# Altium footprint library MOLEX THD.PcbLib: 71 footprints (part 3 of 5)
Each footprint in its own frame and in the unit in brackets; x right, y up, seen from the top. Pads: shape width x height; smd on the part's side, far side on the other; paste and mask are expansions set on the pad; w line width, h text height; cw(c..) or ccw(c..) is an arc to the next point about the centre after c.
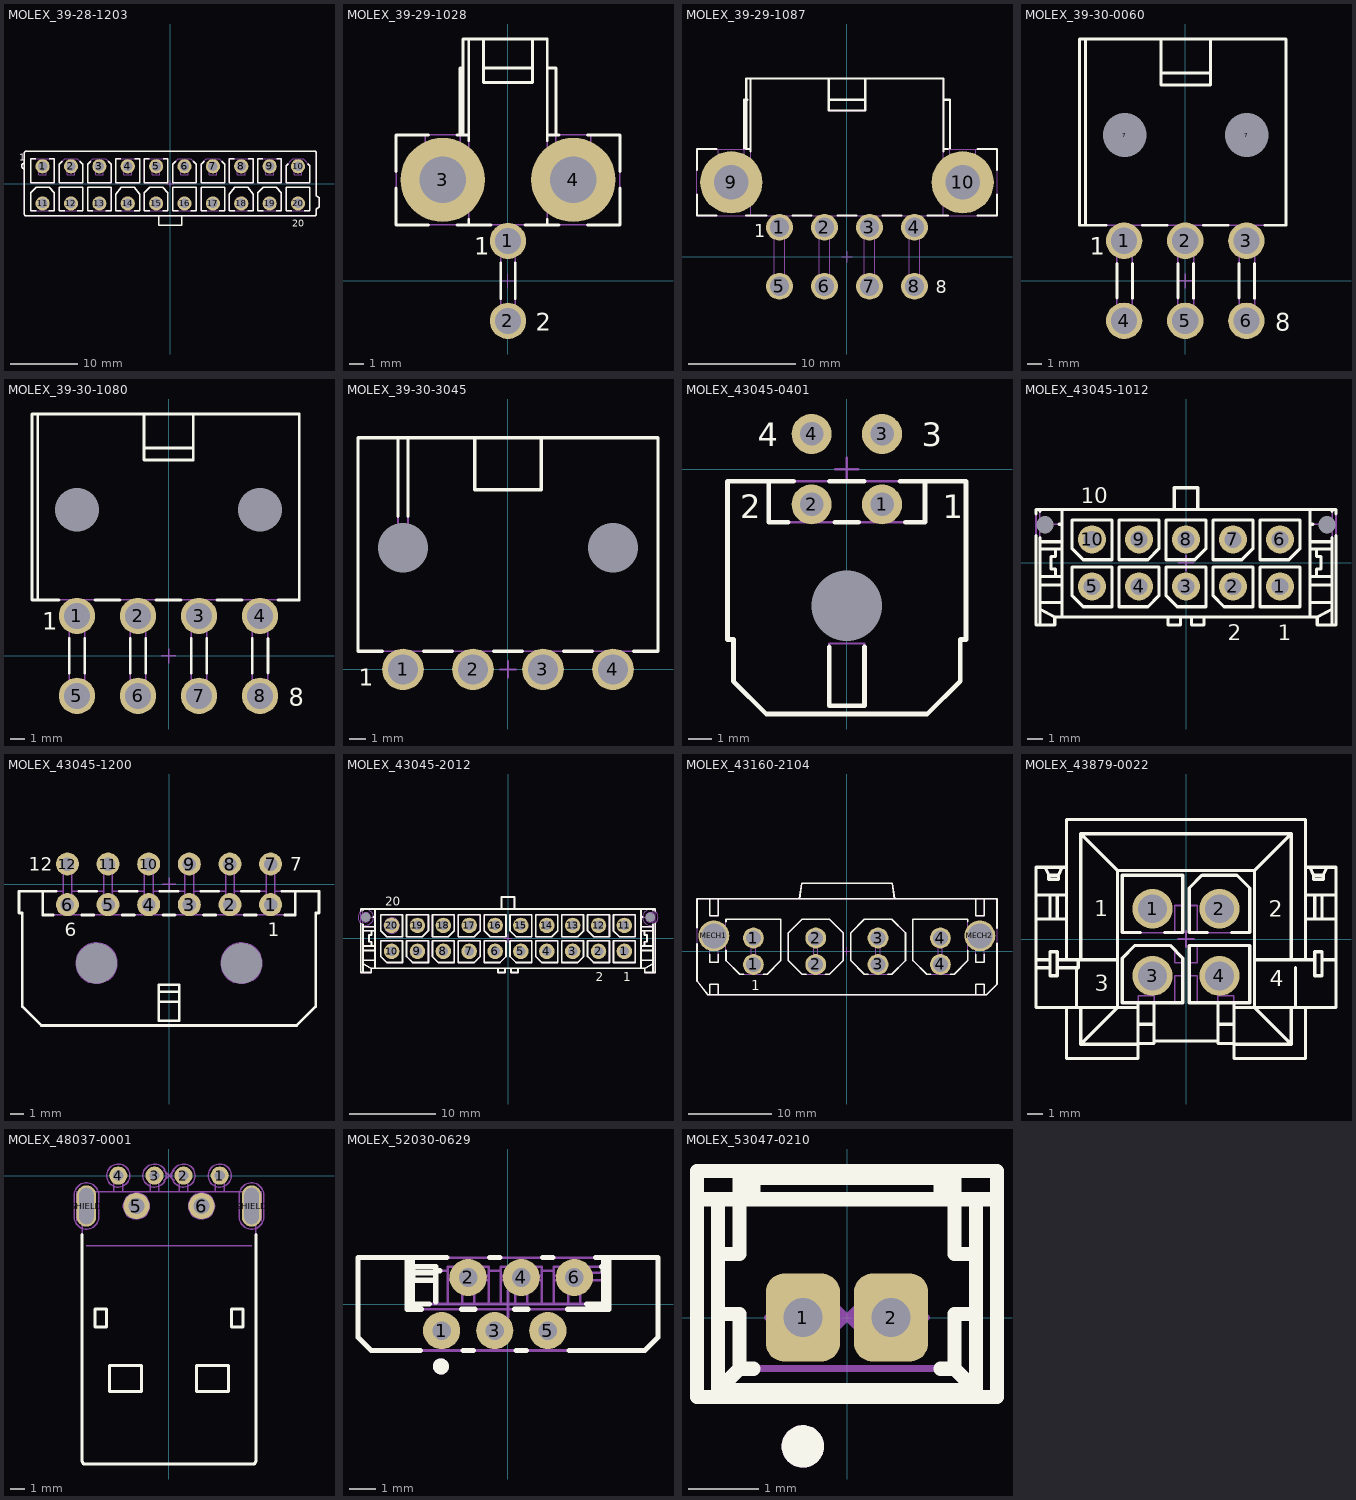
[diagram p2: the footprints below, top view; thin cyan lines are the x and y axes]

## MOLEX_39-28-1203 [mm] "4.20mm (.165\") Pitch Mini-Fit Jr. Header, Dual Row, Vertical, without Snap-in Plastic Peg PCB Lock, 20 Circuits"
height 13.1
pads (20):
  round 2.1 hole 1.4: 1(-18.9,2.55) 2(-14.7,2.55) 3(-10.5,2.55) 4(-6.3,2.55) 5(-2.1,2.55) 6(2.1,2.55) 7(6.3,2.55) 8(10.5,2.55) 9(14.7,2.55) 10(18.9,2.55) 11(-18.9,-2.95) 12(-14.7,-2.95) 13(-10.5,-2.95) 14(-6.3,-2.95) 15(-2.1,-2.95) 16(2.1,-2.95) 17(6.3,-2.95) 18(10.5,-2.95) 19(14.7,-2.95) 20(18.9,-2.95)
Top Overlay:
  lines w0.2: -21.6,2.2 cw(c-21.6,2.6) -21.6,3 ; -19.92,3.65 -20.65,3.65 -20.65,0.15 -17.15,0.15 -17.15,3.65 -17.88,3.65 ; -19.845,-4.05 -20.65,-4.05 -20.65,-1.35 -19.85,-0.55 -17.95,-0.55 -17.15,-1.35 -17.15,-4.05 -17.955,-4.05 ; -15.998,3.302 -16.45,2.85 -16.45,0.15 -12.95,0.15 -12.95,2.85 -13.402,3.302 ; -15.645,-4.05 -16.45,-4.05 -16.45,-0.55 -12.95,-0.55 -12.95,-4.05 -13.755,-4.05 ; -11.798,3.302 -12.25,2.85 -12.25,0.15 -8.75,0.15 -8.75,2.85 -9.202,3.302 ; -11.445,-4.05 -12.25,-4.05 -12.25,-0.55 -8.75,-0.55 -8.75,-4.05 -9.555,-4.05 ; -7.32,3.65 -8.05,3.65 -8.05,0.15 -4.55,0.15 -4.55,3.65 -5.28,3.65 ; -7.245,-4.05 -8.05,-4.05 -8.05,-1.55 -7.25,-0.55 -5.35,-0.55 -4.55,-1.55 -4.55,-4.05 -5.355,-4.05 ; -3.12,3.65 -3.85,3.65 -3.85,0.15 -0.35,0.15 -0.35,3.65 -1.08,3.65 ; -3.045,-4.05 -3.85,-4.05 -3.85,-1.35 -3.05,-0.55 -1.15,-0.55 -0.35,-1.35 -0.35,-4.05 -1.155,-4.05 ; -1.7,-4.8 -1.7,-6.2 1.7,-6.2 1.7,-4.8 ; 0.802,3.302 0.35,2.85 0.35,0.15 3.85,0.15 3.85,2.85 3.398,3.302 ; 1.155,-4.05 0.35,-4.05 0.35,-0.55 3.85,-0.55 3.85,-4.05 3.045,-4.05 ; 5.002,3.302 4.55,2.85 4.55,0.15 8.05,0.15 8.05,2.85 7.598,3.302 ; 5.355,-4.05 4.55,-4.05 4.55,-0.55 8.05,-0.55 8.05,-4.05 7.245,-4.05 ; 9.48,3.65 8.75,3.65 8.75,0.15 12.25,0.15 12.25,3.65 11.52,3.65 ; 9.555,-4.05 8.75,-4.05 8.75,-1.55 9.55,-0.55 11.45,-0.55 12.25,-1.55 12.25,-4.05 11.445,-4.05 ; 13.68,3.65 12.95,3.65 12.95,0.15 16.45,0.15 16.45,3.65 15.72,3.65 ; 13.755,-4.05 12.95,-4.05 12.95,-1.35 13.75,-0.55 15.65,-0.55 16.45,-1.35 16.45,-4.05 15.645,-4.05 ; 17.456,2.956 17.15,2.65 17.15,0.15 20.65,0.15 20.65,2.65 20.344,2.956 ; 17.955,-4.05 17.15,-4.05 17.15,-0.55 20.65,-0.55 20.65,-4.05 19.845,-4.05 ; -21.6,-4.5 ccw(c-21.3,-4.5) -21.3,-4.8 21.3,-4.8 ccw(c21.3,-4.5) 21.6,-4.5 21.6,-3.8 22,-3.464 22,-2.136 21.6,-1.8 21.6,4.5 ccw(c21.3,4.5) 21.3,4.8 -21.3,4.8 ccw(c-21.3,4.5) -21.6,4.5 -21.6,-4.5
  text "1" at -22.392,3.382 h1
  text "20" at 18.033,-6.418 h1
Mechanical 8:
  lines w0.1: -19.4,-2.95 -18.9,-2.95 ; -19.4,2.55 -18.9,2.55 ; -18.9,-3.45 -18.9,-2.95 ; -18.9,-2.45 -18.9,-2.95 ; -18.9,2.05 -18.9,2.55 ; -18.9,3.05 -18.9,2.55 ; -18.4,-2.95 -18.9,-2.95 ; -18.4,2.55 -18.9,2.55 ; -15.2,-2.95 -14.7,-2.95 ; -15.2,2.55 -14.7,2.55 ; -14.7,-3.45 -14.7,-2.95 ; -14.7,-2.45 -14.7,-2.95 ; -14.7,2.05 -14.7,2.55 ; -14.7,3.05 -14.7,2.55 ; -14.2,-2.95 -14.7,-2.95 ; -14.2,2.55 -14.7,2.55 ; -11,-2.95 -10.5,-2.95 ; -11,2.55 -10.5,2.55 ; -10.5,-3.45 -10.5,-2.95 ; -10.5,-2.45 -10.5,-2.95 ; -10.5,2.05 -10.5,2.55 ; -10.5,3.05 -10.5,2.55 ; -10,-2.95 -10.5,-2.95 ; -10,2.55 -10.5,2.55 ; -6.8,-2.95 -6.3,-2.95 ; -6.8,2.55 -6.3,2.55 ; -6.3,-3.45 -6.3,-2.95 ; -6.3,-2.45 -6.3,-2.95 ; -6.3,2.05 -6.3,2.55 ; -6.3,3.05 -6.3,2.55 ; -5.8,-2.95 -6.3,-2.95 ; -5.8,2.55 -6.3,2.55 ; -2.6,-2.95 -2.1,-2.95 ; -2.6,2.55 -2.1,2.55 ; -2.1,-3.45 -2.1,-2.95 ; -2.1,-2.45 -2.1,-2.95 ; -2.1,2.05 -2.1,2.55 ; -2.1,3.05 -2.1,2.55 ; -1.6,-2.95 -2.1,-2.95 ; -1.6,2.55 -2.1,2.55 ; -0.5,0 0,0 ; 0,-0.5 0,0 ; 0,0.5 0,0 ; 0.5,0 0,0 ; 1.6,-2.95 2.1,-2.95 ; 1.6,2.55 2.1,2.55 ; 2.1,-3.45 2.1,-2.95 ; 2.1,-2.45 2.1,-2.95 ; 2.1,2.05 2.1,2.55 ; 2.1,3.05 2.1,2.55 ; 2.6,-2.95 2.1,-2.95 ; 2.6,2.55 2.1,2.55 ; 5.8,-2.95 6.3,-2.95 ; 5.8,2.55 6.3,2.55 ; 6.3,-3.45 6.3,-2.95 ; 6.3,-2.45 6.3,-2.95 ; 6.3,2.05 6.3,2.55 ; 6.3,3.05 6.3,2.55 ; 6.8,-2.95 6.3,-2.95 ; 6.8,2.55 6.3,2.55 ; 10,-2.95 10.5,-2.95 ; 10,2.55 10.5,2.55 ; 10.5,-3.45 10.5,-2.95 ; 10.5,-2.45 10.5,-2.95 ; 10.5,2.05 10.5,2.55 ; 10.5,3.05 10.5,2.55 ; 11,-2.95 10.5,-2.95 ; 11,2.55 10.5,2.55 ; 14.2,-2.95 14.7,-2.95 ; 14.2,2.55 14.7,2.55 ; 14.7,-3.45 14.7,-2.95 ; 14.7,-2.45 14.7,-2.95 ; 14.7,2.05 14.7,2.55 ; 14.7,3.05 14.7,2.55 ; 15.2,-2.95 14.7,-2.95 ; 15.2,2.55 14.7,2.55 ; 18.4,-2.95 18.9,-2.95 ; 18.4,2.55 18.9,2.55 ; 18.9,-3.45 18.9,-2.95 ; 18.9,-2.45 18.9,-2.95 ; 18.9,2.05 18.9,2.55 ; 18.9,3.05 18.9,2.55 ; 19.4,-2.95 18.9,-2.95 ; 19.4,2.55 18.9,2.55
Mechanical 14:
  drawing of 196 lines, arcs and shapes, not listed
  text "1" at -22.392,3.382 h1
  text "20" at 18.033,-6.418 h1
3D body "MOLEX_39-28-1203.stp": height 12.8, standoff -3.5, extent -22,-6.2 22,4.8

## MOLEX_39-29-1028 [mm] "4.20mm (.165\") Pitch Mini-Fit Jr. Header, Dual Row, Right Angle, with PCB Mounting Flange, 2 Circuits"
height 11.7
pads (4):
  round 2.5 hole 1.8: 1(0,2.75) 2(0,-2.75)
  round 5.8 hole 3.2: 3(-4.5,6.95) 4(4.5,6.95)
Top Overlay:
  lines w0.2: -7.7,6.382 -7.7,3.85 -5.476,3.85 ; -7.7,7.518 -7.7,10.05 -5.476,10.05 ; -3.524,3.85 -1.162,3.85 ; -3.524,10.05 -2.7,10.05 ; -3.3,10.05 -3.3,14.65 -3.1,14.65 ; -3.1,10.05 -3.1,16.65 2.7,16.65 2.7,9.656 ; -2.7,3.85 -2.7,4.244 ; -2.7,9.656 -2.7,16.65 ; -1.7,14.65 1.7,14.65 ; -1.7,16.65 -1.7,13.65 1.7,13.65 1.7,16.65 ; -0.5,-1.23 -0.5,1.23 ; 0.5,-1.23 0.5,1.23 ; 1.162,3.85 3.524,3.85 ; 2.7,3.85 2.7,4.244 ; 2.7,10.05 3.524,10.05 ; 2.7,14.65 3.3,14.65 3.3,10.05 ; 5.476,3.85 7.7,3.85 7.7,6.382 ; 5.476,10.05 7.7,10.05 7.7,7.518
  text "2" at 1.917,-3.425 h1.2
  text "1" at -2.325,1.8 h1.2
Mechanical 8:
  lines w0.05: -5,6.95 -4.5,6.95 ; -4.5,6.45 -4.5,6.95 ; -4.5,7.45 -4.5,6.95 ; -4,6.95 -4.5,6.95 ; -0.5,-2.75 0,-2.75 ; -0.5,0 0,0 ; -0.5,2.75 0,2.75 ; 0,-3.25 0,-2.75 ; 0,-2.25 0,-2.75 ; 0,-0.5 0,0 ; 0,0.5 0,0 ; 0,2.25 0,2.75 ; 0,3.25 0,2.75 ; 0.5,-2.75 0,-2.75 ; 0.5,0 0,0 ; 0.5,2.75 0,2.75 ; 4,6.95 4.5,6.95 ; 4.5,6.45 4.5,6.95 ; 4.5,7.45 4.5,6.95 ; 5,6.95 4.5,6.95
Mechanical 14:
  lines w0.1: -5.7,10.05 -5.7,6.95 ; -3.1,10.05 -3.1,16.65 2.7,16.65 2.7,3.85 ; -3.1,14.65 -3.3,14.65 -3.3,6.95 ; -2.7,3.85 -2.7,16.65 ; -2.7,10.05 -7.7,10.05 -7.7,3.85 7.7,3.85 7.7,10.05 2.7,10.05 ; -1.7,14.65 1.7,14.65 ; -1.7,16.65 -1.7,13.65 1.7,13.65 1.7,16.65 ; -0.5,3.85 -0.5,-3.25 0.5,-3.25 0.5,3.85 ; 2.7,14.65 3.3,14.65 3.3,6.95 ; 5.7,10.05 5.7,6.95 ; -5.7,6.95 ccw(c-4.5,6.95) -3.3,6.95 ; -5.7,6.95 cw(c-4.5,6.95) -3.3,6.95 ; 3.3,6.95 cw(c4.5,6.95) 5.7,6.95 ; 3.3,6.95 ccw(c4.5,6.95) 5.7,6.95
  text "2" at 1.917,-3.425 h1.2
  text "1" at -2.325,1.8 h1.2
3D body "MOLEX_39-29-1028.stp": height 11.4, standoff -3.5, extent -7.7,-3.25 7.7,16.65

## MOLEX_39-29-1087 [mm] "4.20mm (.165\") Pitch Mini-Fit Jr. Header, Dual Row, Right Angle, with PCB Mounting Flange, 8 Circuits"
height 11.7
pads (10):
  round 2.5 hole 1.8: 1(-6.3,2.75) 2(-2.1,2.75) 3(2.1,2.75) 4(6.3,2.75) 5(-6.3,-2.75) 6(-2.1,-2.75) 7(2.1,-2.75) 8(6.3,-2.75)
  round 5.8 hole 3.2: 9(-10.8,6.95) 10(10.8,6.95)
Top Overlay:
  lines w0.2: -14,5.801 -14,3.85 -12.196,3.85 ; -14,8.099 -14,10.05 -12.196,10.05 ; -9.6,10.131 -9.6,14.65 -9.3,14.65 ; -9.404,3.85 -7.53,3.85 ; -9.404,10.05 -9,10.05 ; -9.4,10.05 -9.398,16.65 ; -9.4,16.65 9,16.65 9,9.834 ; -9,9.834 -9,16.65 ; -5.07,3.85 -3.33,3.85 ; -1.7,14.65 1.7,14.65 ; -1.7,16.65 -1.7,13.65 1.7,13.65 1.7,16.65 ; -0.87,3.85 0.87,3.85 ; 3.33,3.85 5.07,3.85 ; 7.53,3.85 9.404,3.85 ; 9,10.05 9.404,10.05 ; 9.05,14.65 9.6,14.65 9.6,10.131 ; 12.196,3.85 14,3.85 14,5.801 ; 12.196,10.05 14,10.05 14,8.099
  text "8" at 8.267,-3.425 h1.2
  text "1" at -8.675,1.8 h1.2
Mechanical 8:
  lines w0.1: -11.3,6.95 -10.8,6.95 ; -10.8,6.45 -10.8,6.95 ; -10.8,7.45 -10.8,6.95 ; -10.3,6.95 -10.8,6.95 ; -6.8,-2.75 -6.3,-2.75 ; -6.8,2.75 -6.3,2.75 ; -6.3,-3.25 -6.3,-2.75 ; -6.3,-2.25 -6.3,-2.75 ; -6.3,2.25 -6.3,2.75 ; -6.3,3.25 -6.3,2.75 ; -5.8,-2.75 -6.3,-2.75 ; -5.8,2.75 -6.3,2.75 ; -2.6,-2.75 -2.1,-2.75 ; -2.6,2.75 -2.1,2.75 ; -2.1,-3.25 -2.1,-2.75 ; -2.1,-2.25 -2.1,-2.75 ; -2.1,2.25 -2.1,2.75 ; -2.1,3.25 -2.1,2.75 ; -1.6,-2.75 -2.1,-2.75 ; -1.6,2.75 -2.1,2.75 ; -0.5,0 0,0 ; 0,-0.5 0,0 ; 0,0.5 0,0 ; 0.5,0 0,0 ; 1.6,-2.75 2.1,-2.75 ; 1.6,2.75 2.1,2.75 ; 2.1,-3.25 2.1,-2.75 ; 2.1,-2.25 2.1,-2.75 ; 2.1,2.25 2.1,2.75 ; 2.1,3.25 2.1,2.75 ; 2.6,-2.75 2.1,-2.75 ; 2.6,2.75 2.1,2.75 ; 5.8,-2.75 6.3,-2.75 ; 5.8,2.75 6.3,2.75 ; 6.3,-3.25 6.3,-2.75 ; 6.3,-2.25 6.3,-2.75 ; 6.3,2.25 6.3,2.75 ; 6.3,3.25 6.3,2.75 ; 6.8,-2.75 6.3,-2.75 ; 6.8,2.75 6.3,2.75 ; 10.3,6.95 10.8,6.95 ; 10.8,6.45 10.8,6.95 ; 10.8,7.45 10.8,6.95 ; 11.3,6.95 10.8,6.95
Mechanical 14:
  circle w0.1: c-10.8,6.95 r1.2
  circle w0.1: c10.8,6.95 r1.2
  lines w0.1: -12,6.95 -12,10.05 ; -9.6,6.95 -9.6,14.65 -9.3,14.65 ; -9.4,10.05 -9.398,16.65 ; -9.4,16.65 9,16.65 9,3.85 ; -9,3.85 -9,16.65 ; -9,10.05 -14,10.05 -14,3.85 14,3.85 14,10.05 9,10.05 ; -6.8,3.85 -6.8,-3.25 -5.8,-3.25 -5.8,3.85 ; -2.6,3.85 -2.6,-3.25 -1.6,-3.25 -1.6,3.85 ; -1.7,14.65 1.7,14.65 ; -1.7,16.65 -1.7,13.65 1.7,13.65 1.7,16.65 ; 1.6,3.85 1.6,-3.25 2.6,-3.25 2.6,3.85 ; 5.8,3.85 5.8,-3.25 6.8,-3.25 6.8,3.85 ; 9.05,14.65 9.6,14.65 9.6,6.95 ; 12,6.95 12,10.05
  text "8" at 8.267,-3.425 h1.2
  text "1" at -8.675,1.8 h1.2
3D body "MOLEX_39-29-1087.stp": height 11.4, standoff -3.5, extent -14,-3.25 14,16.65

## MOLEX_39-30-0060 [mm] "4.20mm (.165\") Pitch Mini-Fit Jr. Header, Dual Row, Right Angle with Snap-in Plastic Peg PCB Lock, 8 Circuits"
height 11.4
pads (8):
  round 2.5 hole 1.8: 1(-4.2,2.75) 2(0,2.75) 3(4.2,2.75) 4(-4.2,-2.75) 5(0,-2.75) 6(4.2,-2.75)
  round 0.5 hole 3 unplated mask+1.25: 7(-4.165,10.015) 7(4.235,10.015)
Top Overlay:
  lines w0.2: -6.865,3.815 -6.865,16.615 ; -5.46,3.815 -7.265,3.815 -7.265,16.615 6.935,16.615 6.935,3.815 5.46,3.815 ; -4.7,-1.178 -4.7,1.178 ; -3.63,-1.202 -3.63,1.202 ; -2.94,3.815 -1.26,3.815 ; -1.665,14.265 1.735,14.265 ; -1.665,16.615 -1.665,13.443 1.735,13.443 1.735,16.615 ; -0.5,-1.178 -0.5,1.178 ; 0.57,-1.202 0.57,1.202 ; 1.26,3.815 2.94,3.815 ; 3.7,-1.178 3.7,1.178 ; 4.77,-1.202 4.77,1.202
  text "1" at -6.575,1.8 h1.2
  text "8" at 6.167,-3.425 h1.2
Mechanical 8:
  lines w0.1: -4.7,-2.75 -4.2,-2.75 ; -4.7,2.75 -4.2,2.75 ; -4.665,10.015 -4.165,10.015 ; -4.2,-3.25 -4.2,-2.75 ; -4.2,-2.25 -4.2,-2.75 ; -4.2,2.25 -4.2,2.75 ; -4.2,3.25 -4.2,2.75 ; -4.165,9.515 -4.165,10.015 ; -4.165,10.515 -4.165,10.015 ; -3.7,-2.75 -4.2,-2.75 ; -3.7,2.75 -4.2,2.75 ; -3.665,10.015 -4.165,10.015 ; -0.5,-2.75 0,-2.75 ; -0.5,0 0,0 ; -0.5,2.75 0,2.75 ; 0,-3.25 0,-2.75 ; 0,-2.25 0,-2.75 ; 0,-0.5 0,0 ; 0,0.5 0,0 ; 0,2.25 0,2.75 ; 0,3.25 0,2.75 ; 0.5,-2.75 0,-2.75 ; 0.5,0 0,0 ; 0.5,2.75 0,2.75 ; 3.7,-2.75 4.2,-2.75 ; 3.7,2.75 4.2,2.75 ; 3.735,10.015 4.235,10.015 ; 4.2,-3.25 4.2,-2.75 ; 4.2,-2.25 4.2,-2.75 ; 4.2,2.25 4.2,2.75 ; 4.2,3.25 4.2,2.75 ; 4.235,9.515 4.235,10.015 ; 4.235,10.515 4.235,10.015 ; 4.7,-2.75 4.2,-2.75 ; 4.7,2.75 4.2,2.75 ; 4.735,10.015 4.235,10.015
Mechanical 14:
  lines w0.1: -6.865,3.815 -6.865,16.615 ; -4.7,3.815 -4.7,-3.32 -3.63,-3.32 -3.63,3.815 ; -1.665,14.265 1.735,14.265 ; -1.665,16.615 -1.665,13.443 1.735,13.443 1.735,16.615 ; -0.5,3.815 -0.5,-3.32 0.57,-3.32 0.57,3.815 ; 3.7,3.815 3.7,-3.32 4.77,-3.32 4.77,3.815 ; -7.265,3.815 -7.265,16.615 6.935,16.615 6.935,3.815 -7.265,3.815
  text "1" at -6.575,1.8 h1.2
  text "8" at 6.167,-3.425 h1.2
3D body "MOLEX_39-30-0060.stp": height 11.4, standoff -3.6, extent -7.265,-3.32 6.935,16.615

## MOLEX_39-30-1080 [mm] "4.20mm (.165\") Pitch Mini-Fit Jr. Header, Dual Row, Right Angle with Snap-in Plastic Peg PCB Lock, 8 Circuits"
height 11.4
pads (10):
  round 2.5 hole 1.8: 1(-6.3,2.75) 2(-2.1,2.75) 3(2.1,2.75) 4(6.3,2.75) 5(-6.3,-2.75) 6(-2.1,-2.75) 7(2.1,-2.75) 8(6.3,-2.75)
  round 0.5 hole 3 unplated mask+1.25: 9(-6.3,10.05) 9(6.3,10.05)
Top Overlay:
  lines w0.2: -9,3.85 -9,16.65 ; -7.53,3.85 -9.4,3.85 -9.4,16.65 9,16.65 9,3.85 7.53,3.85 ; -6.835,-1.189 -6.835,1.189 ; -5.765,-1.189 -5.765,1.189 ; -5.07,3.85 -3.33,3.85 ; -2.635,-1.189 -2.635,1.189 ; -1.7,14.3 1.7,14.3 ; -1.7,16.65 -1.7,13.478 1.7,13.478 1.7,16.65 ; -1.565,-1.189 -1.565,1.189 ; -0.87,3.85 0.87,3.85 ; 1.565,-1.189 1.565,1.189 ; 2.635,-1.189 2.635,1.189 ; 3.33,3.85 5.07,3.85 ; 5.765,-1.189 5.765,1.189 ; 6.835,-1.189 6.835,1.189
  text "8" at 8.267,-3.425 h1.2
  text "1" at -8.675,1.8 h1.2
Mechanical 8:
  lines w0.1: -6.8,-2.75 -6.3,-2.75 ; -6.8,2.75 -6.3,2.75 ; -6.8,10.05 -6.3,10.05 ; -6.3,-3.25 -6.3,-2.75 ; -6.3,-2.25 -6.3,-2.75 ; -6.3,2.25 -6.3,2.75 ; -6.3,3.25 -6.3,2.75 ; -6.3,9.55 -6.3,10.05 ; -6.3,10.55 -6.3,10.05 ; -5.8,-2.75 -6.3,-2.75 ; -5.8,2.75 -6.3,2.75 ; -5.8,10.05 -6.3,10.05 ; -2.6,-2.75 -2.1,-2.75 ; -2.6,2.75 -2.1,2.75 ; -2.1,-3.25 -2.1,-2.75 ; -2.1,-2.25 -2.1,-2.75 ; -2.1,2.25 -2.1,2.75 ; -2.1,3.25 -2.1,2.75 ; -1.6,-2.75 -2.1,-2.75 ; -1.6,2.75 -2.1,2.75 ; -0.5,0 0,0 ; 0,-0.5 0,0 ; 0,0.5 0,0 ; 0.5,0 0,0 ; 1.6,-2.75 2.1,-2.75 ; 1.6,2.75 2.1,2.75 ; 2.1,-3.25 2.1,-2.75 ; 2.1,-2.25 2.1,-2.75 ; 2.1,2.25 2.1,2.75 ; 2.1,3.25 2.1,2.75 ; 2.6,-2.75 2.1,-2.75 ; 2.6,2.75 2.1,2.75 ; 5.8,-2.75 6.3,-2.75 ; 5.8,2.75 6.3,2.75 ; 5.8,10.05 6.3,10.05 ; 6.3,-3.25 6.3,-2.75 ; 6.3,-2.25 6.3,-2.75 ; 6.3,2.25 6.3,2.75 ; 6.3,3.25 6.3,2.75 ; 6.3,9.55 6.3,10.05 ; 6.3,10.55 6.3,10.05 ; 6.8,-2.75 6.3,-2.75 ; 6.8,2.75 6.3,2.75 ; 6.8,10.05 6.3,10.05
Mechanical 14:
  lines w0.1: -9,3.85 -9,16.65 ; -6.835,3.85 -6.835,-3.285 -5.765,-3.285 -5.765,3.85 ; -2.635,3.85 -2.635,-3.285 -1.565,-3.285 -1.565,3.85 ; -1.7,14.3 1.7,14.3 ; -1.7,16.65 -1.7,13.478 1.7,13.478 1.7,16.65 ; 1.565,3.85 1.565,-3.285 2.635,-3.285 2.635,3.85 ; 5.765,3.85 5.765,-3.285 6.835,-3.285 6.835,3.85 ; -9.4,3.85 9,3.85 9,16.65 -9.4,16.65 -9.4,3.85
  text "8" at 8.267,-3.425 h1.2
  text "1" at -8.675,1.8 h1.2
3D body "MOLEX_39-30-1080.stp": height 11.4, standoff -3.6, extent -9.4,-3.285 9,16.65

## MOLEX_39-30-3045 [mm] "4.20mm (.165\") Pitch Mini-Fit Jr. Header, Single Row, Right Angle, with Snap-in Plastic Peg PCB Lock, 4 Circuits"
height 12.8
pads (6):
  round 2.5 hole 1.8: 1(-6.3,0) 2(-2.1,0) 3(2.1,0) 4(6.3,0)
  round 0.5 hole 3 unplated mask+1.25: MECH1(-6.3,7.3) MECH2(6.3,7.3)
Top Overlay:
  lines w0.2: -7.53,1.1 -9,1.1 -9,13.9 9,13.9 9,1.1 7.53,1.1 ; -6.6,9.176 -6.6,13.9 ; -6,9.176 -6,13.9 ; -5.07,1.1 -3.33,1.1 ; -2,13.9 -2,10.778 2,10.778 2,13.9 ; -0.87,1.1 0.87,1.1 ; 3.33,1.1 5.07,1.1
  text "1" at -8.967,-0.968 h1
Mechanical 8:
  lines w0.1: -6.8,0 -6.3,0 ; -6.8,7.3 -6.3,7.3 ; -6.3,-0.5 -6.3,0 ; -6.3,0.5 -6.3,0 ; -6.3,6.8 -6.3,7.3 ; -6.3,7.8 -6.3,7.3 ; -5.8,0 -6.3,0 ; -5.8,7.3 -6.3,7.3 ; -2.6,0 -2.1,0 ; -2.1,-0.5 -2.1,0 ; -2.1,0.5 -2.1,0 ; -1.6,0 -2.1,0 ; -0.5,0 0,0 ; 0,-0.5 0,0 ; 0,0.5 0,0 ; 0.5,0 0,0 ; 1.6,0 2.1,0 ; 2.1,-0.5 2.1,0 ; 2.1,0.5 2.1,0 ; 2.6,0 2.1,0 ; 5.8,0 6.3,0 ; 5.8,7.3 6.3,7.3 ; 6.3,-0.5 6.3,0 ; 6.3,0.5 6.3,0 ; 6.3,6.8 6.3,7.3 ; 6.3,7.8 6.3,7.3 ; 6.8,0 6.3,0 ; 6.8,7.3 6.3,7.3
Mechanical 14:
  lines w0.1: -6.8,1.1 -6.8,-0.5 -5.8,-0.5 -5.8,1.1 ; -6.6,13.9 -6.6,7.6 -6,7.6 -6,13.9 ; -2.6,1.1 -2.6,-0.5 -1.6,-0.5 -1.6,1.1 ; -2,13.9 -2,10.778 2,10.778 2,13.9 ; 1.6,1.1 1.6,-0.5 2.6,-0.5 2.6,1.1 ; 5.8,1.1 5.8,-0.5 6.8,-0.5 6.8,1.1 ; -9,1.1 9,1.1 9,13.9 -9,13.9 -9,1.1
  text "1" at -8.967,-0.968 h1
3D body "MOLEX_39-30-3045.stp": height 7.2, standoff -3.5, extent -9,-0.5 9,13.9

## MOLEX_43045-0401 [mm] "3.00mm (.118\") Pitch Micro-Fit 3.0™ Header, Dual Row, Vertical, with Snap-in Plastic Peg PCB Lock, 4 Circuits"
height 12.8
pads (5):
  round 1.7 hole 1: 1(1.5,-1.5) 2(-1.5,-1.5) 3(1.5,1.5) 4(-1.5,1.5)
  round 0.5 hole 3 unplated mask+1.25: MECH1(0,-5.82)
Top Overlay:
  lines w0.2: -3.325,-0.51 -3.325,-2.26 -2.492,-2.26 ; -2.263,-0.51 -5.075,-0.51 -5.075,-7.25 -4.825,-7.25 -4.825,-9.02 -3.425,-10.42 3.425,-10.42 4.825,-9.02 4.825,-7.25 5.075,-7.25 5.075,-0.51 2.263,-0.51 ; -0.75,-7.566 -0.75,-10.07 0.75,-10.07 0.75,-7.566 ; -0.737,-0.51 0.737,-0.51 ; -0.508,-2.26 0.508,-2.26 ; 2.492,-2.26 3.325,-2.26 3.325,-0.51
  text "1" at 4.092,-2.078 h1
  text "3" at 3.192,0.972 h1
  text "4" at -3.783,0.972 h1
  text "2" at -4.533,-2.078 h1
Mechanical 8:
  circle w0.1: c1.5,-1.5 r0.5
  circle w0.1: c1.5,1.5 r0.5
  circle w0.1: c-1.5,1.5 r0.5
  circle w0.1: c-1.5,-1.5 r0.5
  lines w0.1: -2,-1.5 -1.5,-1.5 ; -2,1.5 -1.5,1.5 ; -1.5,-2 -1.5,-1.5 ; -1.5,-1 -1.5,-1.5 ; -1.5,1 -1.5,1.5 ; -1.5,2 -1.5,1.5 ; -1,-1.5 -1.5,-1.5 ; -1,1.5 -1.5,1.5 ; -0.5,-5.82 0,-5.82 ; -0.5,0 0,0 ; 0,-6.32 0,-5.82 ; 0,-5.32 0,-5.82 ; 0,-0.5 0,0 ; 0,0.5 0,0 ; 0.5,-5.82 0,-5.82 ; 0.5,0 0,0 ; 1,-1.5 1.5,-1.5 ; 1,1.5 1.5,1.5 ; 1.5,-2 1.5,-1.5 ; 1.5,-1 1.5,-1.5 ; 1.5,1 1.5,1.5 ; 1.5,2 1.5,1.5 ; 2,-1.5 1.5,-1.5 ; 2,1.5 1.5,1.5
Mechanical 14:
  lines w0.1: -3.325,-0.51 -3.325,-2.26 3.325,-2.26 3.325,-0.51 ; -5.075,-7.25 -5.075,-0.51 5.075,-0.51 5.075,-7.25 4.825,-7.25 4.825,-9.02 3.425,-10.42 -3.425,-10.42 -4.825,-9.02 -4.825,-7.25 -5.075,-7.25 ; -0.75,-10.07 -0.75,-7.42 0.75,-7.42 0.75,-10.07 -0.75,-10.07
  text "1" at 4.092,-2.078 h1
  text "3" at 3.192,0.972 h1
  text "4" at -3.783,0.972 h1
  text "2" at -4.533,-2.078 h1
3D body "MOLEX_43045-0401.stp": height 8.77, standoff -3.18, extent -5.075,-10.42 5.075,1.82

## MOLEX_43045-1012 [mm] "3.00mm (.118\") Pitch Micro-Fit 3.0™ Header, Dual Row, Vertical, with PCB Polarizing Peg, 10 Circuits"
height 9.91
pads (12):
  round 1.8 hole 1.1: 1(6,-1.5) 2(3,-1.5) 3(0,-1.5) 4(-3,-1.5) 5(-6,-1.5) 6(6,1.5) 7(3,1.5) 8(0,1.5) 9(-3,1.5) 10(-6,1.5)
  round 0.5 hole 1.1 unplated mask+0.3: P1(-9,2.44) P2(9,2.44)
Top Overlay:
  lines w0.2: -9.575,1.748 -9.575,-3.97 -8.375,-3.97 -8.375,-3.46 ; -9.575,3.132 -9.575,3.4 9.575,3.4 9.575,3.132 ; -9.325,-3.97 -9.325,1.601 ; -9.325,-2.96 -8.375,-3.46 ; -9.325,-2.53 -7.925,-2.53 -7.925,-1.405 -9.325,-1.405 ; -9.325,-0.875 -7.925,-0.875 ; -9.325,0.875 -7.925,0.875 ; -9.325,1.345 -7.925,1.345 ; -9.325,3.279 -9.325,3.4 ; -8.325,-0.875 -8.325,-0.4 -8.625,-0.4 -8.625,0.4 -8.325,0.4 -8.325,0.875 ; -8.101,2.47 -7.925,2.47 ; -7.925,-3.46 -7.925,3.4 ; -1.15,-3.46 -1.15,-3.97 -0.35,-3.97 -0.35,-3.46 ; -0.75,3.4 -0.75,4.8 0.75,4.8 0.75,3.4 ; 0.35,-3.46 0.35,-3.97 1.15,-3.97 1.15,-3.46 ; 7.925,-3.46 7.925,3.4 ; 7.925,-2.53 9.325,-2.53 ; 7.925,-1.405 9.325,-1.405 ; 7.925,-0.875 9.325,-0.875 ; 7.925,0.875 9.325,0.875 ; 7.925,1.345 9.325,1.345 ; 7.925,2.47 8.101,2.47 ; 8.325,-0.875 8.325,-0.4 8.625,-0.4 8.625,0.4 8.325,0.4 8.325,0.875 ; 9.325,-3.97 9.325,1.601 ; 9.325,-2.96 8.375,-3.46 ; 9.325,3.279 9.325,3.4 ; 9.575,1.748 9.575,-3.97 8.375,-3.97 8.375,-3.46 ; -8.375,-3.46 8.375,-3.46 ; -7.27,-2.1 -7.27,-0.26 -4.73,-0.26 -4.73,-2.8 -6.57,-2.8 -7.27,-2.1 ; -7.27,0.9 -7.27,2.74 -4.73,2.74 -4.73,0.2 -6.57,0.2 -7.27,0.9 ; -4.27,-2.8 -4.27,-0.26 -1.73,-0.26 -1.73,-2.1 -2.43,-2.8 -4.27,-2.8 ; -4.27,0.2 -4.27,2.74 -1.73,2.74 -1.73,0.9 -2.43,0.2 -4.27,0.2 ; -1.27,-2.1 -1.27,-0.26 1.27,-0.26 1.27,-2.8 -0.57,-2.8 -1.27,-2.1 ; -1.27,0.2 -1.27,2.74 1.27,2.74 1.27,0.9 0.57,0.2 -1.27,0.2 ; 1.73,-2.1 1.73,-0.26 4.27,-0.26 4.27,-2.8 2.43,-2.8 1.73,-2.1 ; 1.73,0.2 1.73,2.74 4.27,2.74 4.27,0.9 3.57,0.2 1.73,0.2 ; 4.73,-2.8 4.73,-0.26 7.27,-0.26 7.27,-2.8 4.73,-2.8 ; 4.73,0.2 6.57,0.2 7.27,0.9 7.27,2.74 4.73,2.74 4.73,0.2
  text "2" at 2.667,-4.953 h1
  text "1" at 5.842,-4.953 h1
  text "10" at -6.731,3.81 h1
Mechanical 8:
  lines w0.1: -9.5,2.44 -9,2.44 ; -9,1.94 -9,2.44 ; -9,2.94 -9,2.44 ; -8.5,2.44 -9,2.44 ; -6.5,-1.5 -6,-1.5 ; -6.5,1.5 -6,1.5 ; -6,-2 -6,-1.5 ; -6,-1 -6,-1.5 ; -6,1 -6,1.5 ; -6,2 -6,1.5 ; -5.5,-1.5 -6,-1.5 ; -5.5,1.5 -6,1.5 ; -3.5,-1.5 -3,-1.5 ; -3.5,1.5 -3,1.5 ; -3,-2 -3,-1.5 ; -3,-1 -3,-1.5 ; -3,1 -3,1.5 ; -3,2 -3,1.5 ; -2.5,-1.5 -3,-1.5 ; -2.5,1.5 -3,1.5 ; -0.5,-1.5 0,-1.5 ; -0.5,0 0,0 ; -0.5,1.5 0,1.5 ; 0,-2 0,-1.5 ; 0,-1 0,-1.5 ; 0,-0.5 0,0 ; 0,0.5 0,0 ; 0,1 0,1.5 ; 0,2 0,1.5 ; 0.5,-1.5 0,-1.5 ; 0.5,0 0,0 ; 0.5,1.5 0,1.5 ; 2.5,-1.5 3,-1.5 ; 2.5,1.5 3,1.5 ; 3,-2 3,-1.5 ; 3,-1 3,-1.5 ; 3,1 3,1.5 ; 3,2 3,1.5 ; 3.5,-1.5 3,-1.5 ; 3.5,1.5 3,1.5 ; 5.5,-1.5 6,-1.5 ; 5.5,1.5 6,1.5 ; 6,-2 6,-1.5 ; 6,-1 6,-1.5 ; 6,1 6,1.5 ; 6,2 6,1.5 ; 6.5,-1.5 6,-1.5 ; 6.5,1.5 6,1.5 ; 8.5,2.44 9,2.44 ; 9,1.94 9,2.44 ; 9,2.94 9,2.44 ; 9.5,2.44 9,2.44
Mechanical 14:
  lines w0.1: -9.325,-3.97 -9.325,3.4 ; -9.325,-2.96 -8.375,-3.46 ; -9.325,-2.53 -7.925,-2.53 -7.925,-1.405 -9.325,-1.405 ; -9.325,-0.875 -7.925,-0.875 ; -9.325,0.875 -7.925,0.875 ; -9.325,1.345 -7.925,1.345 ; -9.325,2.47 -7.925,2.47 ; -8.325,-0.875 -8.325,-0.4 -8.625,-0.4 -8.625,0.4 -8.325,0.4 -8.325,0.875 ; -7.925,-3.46 -7.925,3.4 ; -1.15,-3.46 -1.15,-3.97 -0.35,-3.97 -0.35,-3.46 ; -0.75,3.4 -0.75,4.8 0.75,4.8 0.75,3.4 ; 0.35,-3.46 0.35,-3.97 1.15,-3.97 1.15,-3.46 ; 7.925,-3.46 7.925,3.4 ; 7.925,-2.53 9.325,-2.53 ; 7.925,-1.405 9.325,-1.405 ; 7.925,-0.875 9.325,-0.875 ; 7.925,0.875 9.325,0.875 ; 7.925,1.345 9.325,1.345 ; 7.925,2.47 9.325,2.47 ; 8.325,-0.875 8.325,-0.4 8.625,-0.4 8.625,0.4 8.325,0.4 8.325,0.875 ; 9.325,-3.97 9.325,3.4 ; 9.325,-2.96 8.375,-3.46 ; -8.375,-3.46 8.375,-3.46 ; -8.375,-3.46 -8.375,-3.97 -9.575,-3.97 -9.575,3.4 9.575,3.4 9.575,-3.97 8.375,-3.97 8.375,-3.46 ; -7.27,-2.1 -6.57,-2.8 -4.73,-2.8 -4.73,-0.26 -7.27,-0.26 -7.27,-2.1 ; -7.27,0.9 -6.57,0.2 -4.73,0.2 -4.73,2.74 -7.27,2.74 -7.27,0.9 ; -4.27,-2.8 -2.43,-2.8 -1.73,-2.1 -1.73,-0.26 -4.27,-0.26 -4.27,-2.8 ; -4.27,0.2 -2.43,0.2 -1.73,0.9 -1.73,2.74 -4.27,2.74 -4.27,0.2 ; -1.27,-2.1 -0.57,-2.8 1.27,-2.8 1.27,-0.26 -1.27,-0.26 -1.27,-2.1 ; -1.27,0.2 0.57,0.2 1.27,0.9 1.27,2.74 -1.27,2.74 -1.27,0.2 ; 1.73,-2.1 2.43,-2.8 4.27,-2.8 4.27,-0.26 1.73,-0.26 1.73,-2.1 ; 1.73,0.2 3.57,0.2 4.27,0.9 4.27,2.74 1.73,2.74 1.73,0.2 ; 4.73,-2.8 7.27,-2.8 7.27,-0.26 4.73,-0.26 4.73,-2.8 ; 4.73,0.2 4.73,2.74 7.27,2.74 7.27,0.9 6.57,0.2 4.73,0.2
  text "2" at 2.667,-4.953 h1
  text "10" at -6.731,3.81 h1
  text "1" at 5.842,-4.953 h1
3D body "MOLEX_43045-1012.stp": height 9.91, standoff -3.18, extent -9.575,-3.97 9.575,4.8
